# Altium footprint library STM32F0.PcbLib: 228 footprints (part 1 of 16)
Each footprint in its own frame and in the unit in brackets; x right, y up, seen from the top. Pads: shape width x height; smd on the part's side, far side on the other; paste and mask are expansions set on the pad; w line width, h text height; cw(c..) or ccw(c..) is an arc to the next point about the centre after c.
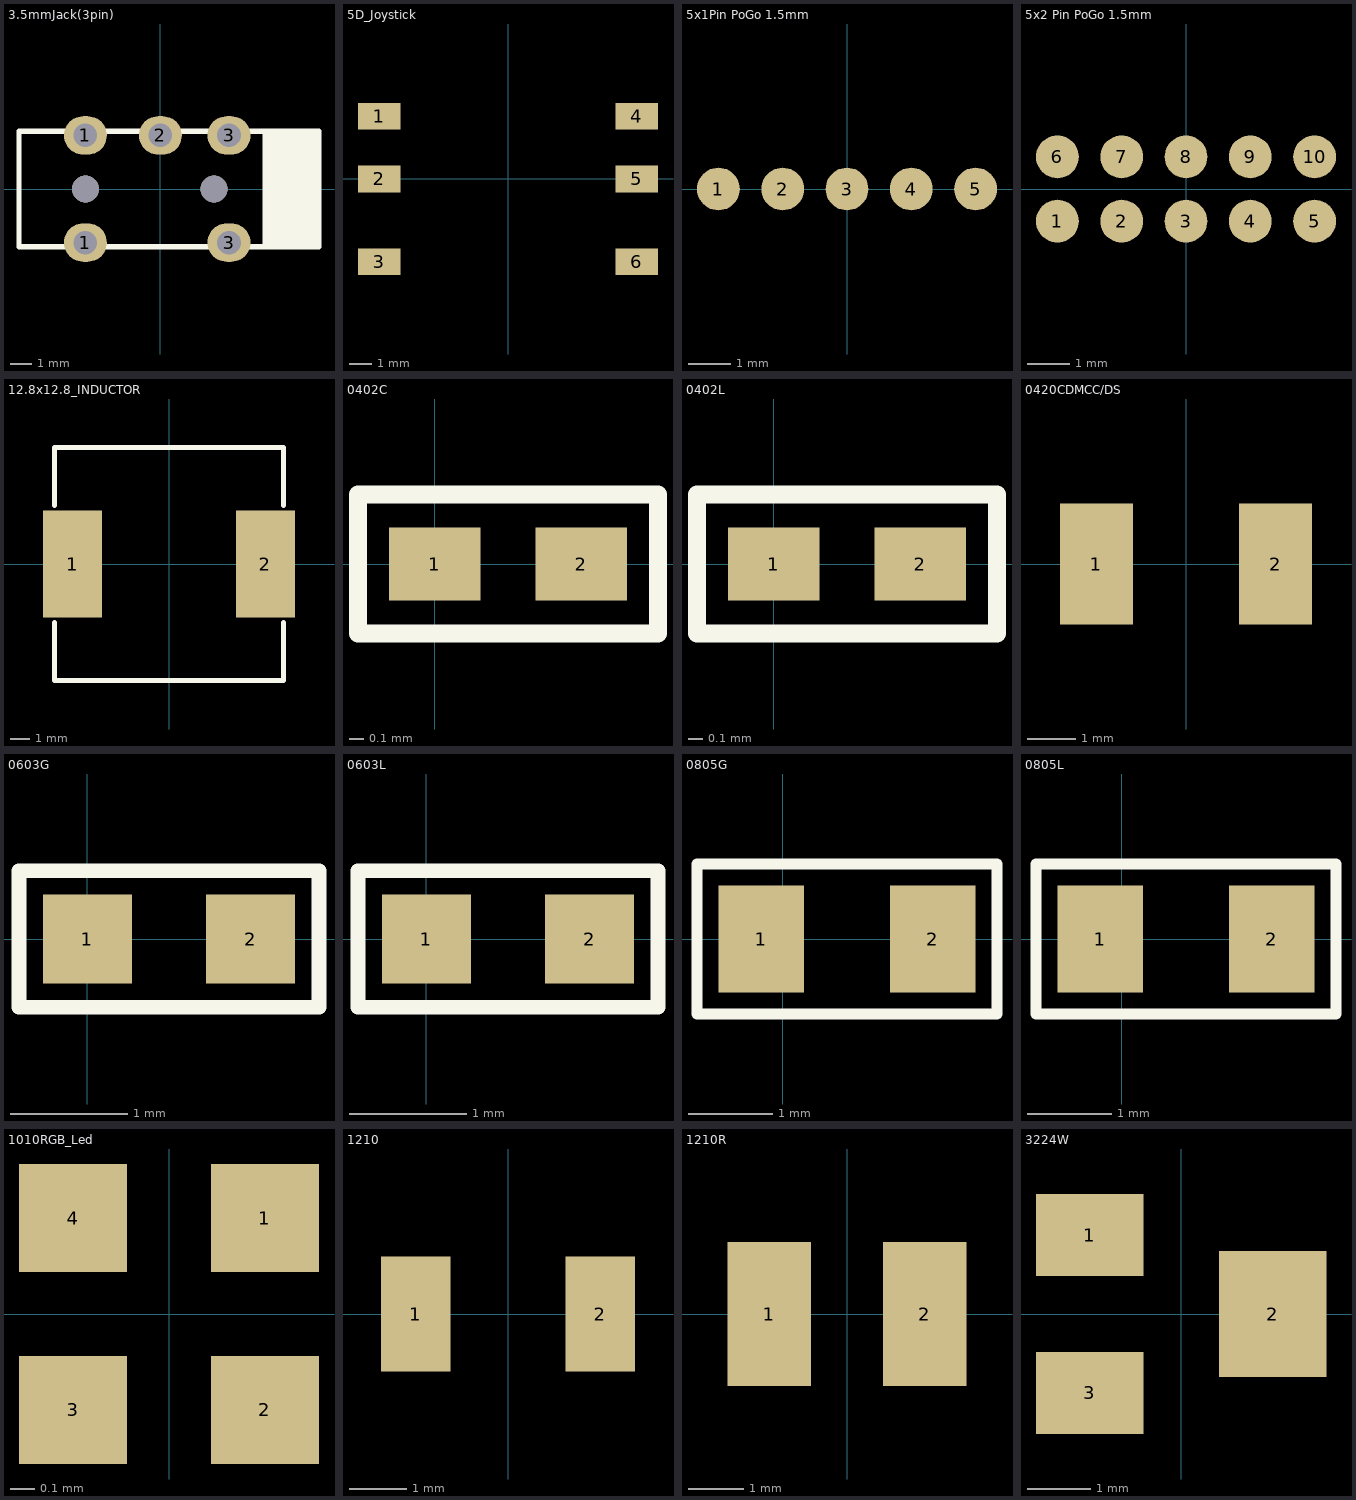
[diagram p0: the footprints below, top view; thin cyan lines are the x and y axes]

## 3.5mmJack(3pin) [mm]
pads (7):
  oval 2x1.8 hole 1.1: 1(-3.5,-2.5) 1(-3.5,2.5) 2(0,2.5) 3(3.2,-2.5) 3(3.2,2.5)
  round 1.25 hole 1.25 unplated: ""(-3.5,0) ""(2.5,0)
Top Overlay:
  rectangle: 5,-2.7 7.4,2.7
  lines w0.254: 5,-2.7 4.9,-2.6 4.9,0 4.9,2.6 5,2.7 ; -6.6,-2.7 7.4,-2.7 7.4,2.7 -6.6,2.7 -6.6,-2.7

## 5D_Joystick [mm]
pads (6):
  rect 1.9x1.2 smd: 1(-5.75,2.8) 2(-5.75,0) 3(-5.75,-3.7) 4(5.75,2.8) 5(5.75,0) 6(5.75,-3.7)
3D body "User Library-SMD Nav Joystick.STEP": height 9, standoff -0.5, extent -6.454,-5.628 6.459,4.772

## 5x1Pin PoGo 1.5mm [mm]
pads (5):
  round 1 smd: 1(-3,0) 2(-1.5,0) 3(0,0) 4(1.5,0) 5(3,0)

## 5x2 Pin PoGo 1.5mm [mm]
pads (10):
  round 1 smd: 1(-3,-0.75) 2(-1.5,-0.75) 3(0,-0.75) 4(1.5,-0.75) 5(3,-0.75) 6(-3,0.75) 7(-1.5,0.75) 8(0,0.75) 9(1.5,0.75) 10(3,0.75)

## 12.8x12.8_INDUCTOR [mm]
pads (2):
  rect 3.1x5.6 smd: 1(-5.05,0) 2(5.05,0)
Top Overlay:
  lines w0.254: -6,-3.048 -6,-6.096 6,-6.096 6,-3.048 ; -6,3.048 -6,6.096 6,6.096 6,3.048
3D body "User Library-A3D-010-00005.step": height 8, standoff 0, extent -6,-6 6,6

## 0402C [mil]
pads (2):
  rect 25x20 smd: 1(0,0) 2(40,0)
Top Overlay:
  lines w5: -21,-19 -21,19 61,19 61,-19 -21,-19
3D body: height 19, standoff 0, extent 2,-9 9,9
3D body: height 18, standoff 0, extent 2.19,-8 37.19,8
3D body: height 19, standoff 0, extent 32,-9 39,9

## 0402L [mil]
pads (2):
  rect 25x20 smd: 1(0,0) 2(40,0)
Top Overlay:
  lines w5: -21,-19 61,-19 61,19 -21,19 -21,-19
3D body: height 19, standoff 0, extent 32,-9 39,9
3D body: height 18, standoff 0, extent 2.19,-8 37.19,8
3D body: height 19, standoff 0, extent 2,-9 9,9

## 0420CDMCC/DS [mm]
pads (2):
  rect 1.5x2.5 smd: 1(-1.85,0) 2(1.85,0)
3D body "User Library-0420CDMCB_DS.step": height 1.91, standoff -0.01, extent -2.25,-2.05 2.25,2.05

## 0603G [mil] "CAPACITOR 0603"
pads (2):
  rect 30x30 smd: 1(0,0) 2(55,0)
Top Overlay:
  lines w5: -23,-23 78,-23 78,23 -23,23 -23,-23
3D body: height 11, standoff 10, extent 44.5,-12 49.5,-2
3D body: height 18, standoff 0, extent -3,-14 58,14
3D body: height 19, standoff 0, extent 43,-15 59,15
3D body: height 19, standoff 0, extent -4,-15 12,15
3D body: height 11, standoff 10, extent 29.5,-12 34.5,-2
3D body: height 11, standoff 10, extent 29.5,3 34.5,13
3D body: height 11, standoff 10, extent 22,3 27,13
3D body: height 11, standoff 10, extent 7,3 12,13
3D body: height 11, standoff 10, extent 14.5,3 19.5,13
3D body: height 11, standoff 10, extent 37,3 42,13
3D body: height 11, standoff 10, extent 44.5,3 49.5,13
3D body: height 11, standoff 10, extent 22,-12 27,-2
3D body: height 11, standoff 10, extent 14.5,-12 19.5,-2
3D body: height 11, standoff 10, extent 7,-12 12,-2

## 0603L [mil] "CAPACITOR 0603"
pads (2):
  rect 30x30 smd: 1(0,0) 2(55,0)
Top Overlay:
  lines w5: -23,-23 -23,23 78,23 78,-23 -23,-23
3D body: height 19, standoff 0, extent -4,-15 12,15
3D body: height 19, standoff 0, extent 43,-15 59,15
3D body: height 18, standoff 0, extent -3,-14 58,14

## 0805G [mil] "CAPACITOR 0805"
pads (2):
  rect 40x50 smd: 1(-10,0) 2(70,0)
Top Overlay:
  lines w5: -40,-35 100,-35 100,35 -40,35 -40,-35
3D body: height 23, standoff 22, extent 45,2.5 52.5,17.5
3D body: height 23, standoff 22, extent 35,2.5 42.5,17.5
3D body: height 23, standoff 22, extent 10.5,-15 18,0
3D body: height 23, standoff 22, extent -5,2.5 2.5,17.5
3D body: height 23, standoff 22, extent 5,2.5 12.5,17.5
3D body: height 23, standoff 22, extent 15,2.5 22.5,17.5
3D body: height 23, standoff 22, extent 25,2.5 32.5,17.5
3D body: height 23, standoff 22, extent 20.5,-15 28,0
3D body: height 23, standoff 22, extent 0.5,-15 8,0
3D body: height 23, standoff 22, extent 30.5,-15 38,0
3D body: height 23, standoff 22, extent 40.5,-15 48,0
3D body: height 25, standoff 0, extent -10,-24 69,24
3D body: height 26, standoff 0, extent -11,-25 5,25
3D body: height 26, standoff 0, extent 54,-25 70,25

## 0805L [mil] "CAPACITOR 0805"
pads (2):
  rect 40x50 smd: 1(-10,0) 2(70,0)
Top Overlay:
  lines w5: -40,-35 100,-35 100,35 -40,35 -40,-35
3D body: height 23, standoff 22, extent 45,2.5 52.5,17.5
3D body: height 23, standoff 22, extent 35,2.5 42.5,17.5
3D body: height 23, standoff 22, extent 10.5,-15 18,0
3D body: height 23, standoff 22, extent -5,2.5 2.5,17.5
3D body: height 23, standoff 22, extent 5,2.5 12.5,17.5
3D body: height 23, standoff 22, extent 15,2.5 22.5,17.5
3D body: height 23, standoff 22, extent 25,2.5 32.5,17.5
3D body: height 23, standoff 22, extent 20.5,-15 28,0
3D body: height 23, standoff 22, extent 0.5,-15 8,0
3D body: height 23, standoff 22, extent 30.5,-15 38,0
3D body: height 23, standoff 22, extent 40.5,-15 48,0
3D body: height 25, standoff 0, extent -10,-24 69,24
3D body: height 26, standoff 0, extent -11,-25 5,25
3D body: height 26, standoff 0, extent 54,-25 70,25

## 1010RGB_Led [mm]
pads (4):
  rect 0.45x0.45 smd: 1(0.4,0.4) 2(0.4,-0.4) 3(-0.4,-0.4) 4(-0.4,0.4)
3D body "1010SMD.stp": height 0.2, standoff -0.01, extent -0.5,-0.5 0.5,0.5

## 1210 [mm]
pads (2):
  rect 1.2x2 smd: 1(-1.6,0) 2(1.6,0)

## 1210R [mm]
pads (2):
  rect 1.5x2.59 smd: 1(-1.4,0) 2(1.4,0)
3D body "User Library-R_1210.step": height 0.6, standoff 0, extent -1.6,-1.25 1.6,1.25

## 3224W [mm]
pads (3):
  rect 1.7x1.3 smd: 1(-1.45,1.25) 3(-1.45,-1.25)
  rect 1.7x2 smd: 2(1.45,0)